# Altium integrated library WCAP-ATUL_rev15a.intlib: 117 symbols (part 1 of 2) (continued)
## WCAP-ATUL 5x11x2x0.5 860040572001
designator C?, comment 33 μF
WCAP-ATUL Aluminum Electrolytic Capacitors , 33 μF; + / - 20%; 35 V , 5 x 11; Manufacturer: Wurth Elektronik; partNo: 860040572001; E-mail: libraries@we-online.com; Characteristics: Aluminum Electrolytic Capacitor;Recommended soldering: Wave;Operating temperature: –40 °C to +105 °C;Minimized ESR and long life product series;Load life: 4000–10000 h @ +105 °C; ComponentLink1Description: Manufacturer; ComponentLink1URL: http://www.we-online.com; ComponentLink2Description: Datasheet; ComponentLink2URL: http://katalog.we-online.de/pbs/datasheet/860040572001.pdf; Created by: Karrer Zheng; Created Date: 5/13/2015; Capacitance: 33 μF; Application: Applied to high frequency secondary side output filter loop, general switching power supply, DC-DC converter, AC-DC converter, adapter, charger, TV, VCR, DC motor circuit filter, LCD TV digital audio, digital TV, digital camera, digital video camera, satellite receiver and etc.
footprint WCAP-ATUL 5x11x2x0.5
pins: 1, 2

## WCAP-ATUL 5x11x2x0.5 860040572002
designator C?, comment 47 μF
WCAP-ATUL Aluminum Electrolytic Capacitors , 47 μF; + / - 20%; 35 V , 5 x 11; Manufacturer: Wurth Elektronik; partNo: 860040572002; E-mail: libraries@we-online.com; Characteristics: Aluminum Electrolytic Capacitor;Recommended soldering: Wave;Operating temperature: –40 °C to +105 °C;Minimized ESR and long life product series;Load life: 4000–10000 h @ +105 °C; ComponentLink1Description: Manufacturer; ComponentLink1URL: http://www.we-online.com; ComponentLink2Description: Datasheet; ComponentLink2URL: http://katalog.we-online.de/pbs/datasheet/860040572002.pdf; Created by: Karrer Zheng; Created Date: 5/13/2015; Capacitance: 47 μF; Application: Applied to high frequency secondary side output filter loop, general switching power supply, DC-DC converter, AC-DC converter, adapter, charger, TV, VCR, DC motor circuit filter, LCD TV digital audio, digital TV, digital camera, digital video camera, satellite receiver and etc.
footprint WCAP-ATUL 5x11x2x0.5
pins: 1, 2

## WCAP-ATUL 6.3x11x2.5x0.5 860040573003
designator C?, comment 56 μF
WCAP-ATUL Aluminum Electrolytic Capacitors , 56 μF; + / - 20%; 35 V , 6,3 x 11; Manufacturer: Wurth Elektronik; partNo: 860040573003; E-mail: libraries@we-online.com; Characteristics: Aluminum Electrolytic Capacitor;Recommended soldering: Wave;Operating temperature: –40 °C to +105 °C;Minimized ESR and long life product series;Load life: 4000–10000 h @ +105 °C; ComponentLink1Description: Manufacturer; ComponentLink1URL: http://www.we-online.com; ComponentLink2Description: Datasheet; ComponentLink2URL: http://katalog.we-online.de/pbs/datasheet/860040573003.pdf; Created by: Karrer Zheng; Created Date: 5/13/2015; Capacitance: 56 μF; Application: Applied to high frequency secondary side output filter loop, general switching power supply, DC-DC converter, AC-DC converter, adapter, charger, TV, VCR, DC motor circuit filter, LCD TV digital audio, digital TV, digital camera, digital video camera, satellite receiver and etc.
footprint WCAP-ATUL 6.3x11x2.5x0.5
pins: 1, 2

## WCAP-ATUL 6.3x11x2.5x0.5 860040573004
designator C?, comment 100 μF
WCAP-ATUL Aluminum Electrolytic Capacitors , 100 μF; + / - 20%; 35 V , 6,3 x 11; Manufacturer: Wurth Elektronik; partNo: 860040573004; E-mail: libraries@we-online.com; Characteristics: Aluminum Electrolytic Capacitor;Recommended soldering: Wave;Operating temperature: –40 °C to +105 °C;Minimized ESR and long life product series;Load life: 4000–10000 h @ +105 °C; ComponentLink1Description: Manufacturer; ComponentLink1URL: http://www.we-online.com; ComponentLink2Description: Datasheet; ComponentLink2URL: http://katalog.we-online.de/pbs/datasheet/860040573004.pdf; Created by: Karrer Zheng; Created Date: 5/13/2015; Capacitance: 100 μF; Application: Applied to high frequency secondary side output filter loop, general switching power supply, DC-DC converter, AC-DC converter, adapter, charger, TV, VCR, DC motor circuit filter, LCD TV digital audio, digital TV, digital camera, digital video camera, satellite receiver and etc.
footprint WCAP-ATUL 6.3x11x2.5x0.5
pins: 1, 2

## WCAP-ATUL 8x11.5x3.5x0.5 860040574005
designator C?, comment 150 μF
WCAP-ATUL Aluminum Electrolytic Capacitors , 150 μF; + / - 20%; 35 V , 8 x 11,5; Manufacturer: Wurth Elektronik; partNo: 860040574005; E-mail: libraries@we-online.com; Characteristics: Aluminum Electrolytic Capacitor;Recommended soldering: Wave;Operating temperature: –40 °C to +105 °C;Minimized ESR and long life product series;Load life: 4000–10000 h @ +105 °C; ComponentLink1Description: Manufacturer; ComponentLink1URL: http://www.we-online.com; ComponentLink2Description: Datasheet; ComponentLink2URL: http://katalog.we-online.de/pbs/datasheet/860040574005.pdf; Created by: Karrer Zheng; Created Date: 5/13/2015; Capacitance: 150 μF; Application: Applied to high frequency secondary side output filter loop, general switching power supply, DC-DC converter, AC-DC converter, adapter, charger, TV, VCR, DC motor circuit filter, LCD TV digital audio, digital TV, digital camera, digital video camera, satellite receiver and etc.
footprint WCAP-ATUL 8x11.5x3.5x0.5
pins: 1, 2

## WCAP-ATUL 8x16x3.5x0.5 860040574006
designator C?, comment 220 μF
WCAP-ATUL Aluminum Electrolytic Capacitors , 220 μF; + / - 20%; 35 V , 8 x 16; Manufacturer: Wurth Elektronik; partNo: 860040574006; E-mail: libraries@we-online.com; Characteristics: Aluminum Electrolytic Capacitor;Recommended soldering: Wave;Operating temperature: –40 °C to +105 °C;Minimized ESR and long life product series;Load life: 4000–10000 h @ +105 °C; ComponentLink1Description: Manufacturer; ComponentLink1URL: http://www.we-online.com; ComponentLink2Description: Datasheet; ComponentLink2URL: http://katalog.we-online.de/pbs/datasheet/860040574006.pdf; Created by: Karrer Zheng; Created Date: 5/13/2015; Capacitance: 220 μF; Application: Applied to high frequency secondary side output filter loop, general switching power supply, DC-DC converter, AC-DC converter, adapter, charger, TV, VCR, DC motor circuit filter, LCD TV digital audio, digital TV, digital camera, digital video camera, satellite receiver and etc.
footprint WCAP-ATUL 8x16x3.5x0.5
pins: 1, 2

## WCAP-ATUL 8x20x3.5x0.6 860040574008
designator C?, comment 270 μF
WCAP-ATUL Aluminum Electrolytic Capacitors , 270 μF; + / - 20%; 35 V , 8 x 20; Manufacturer: Wurth Elektronik; partNo: 860040574008; E-mail: libraries@we-online.com; Characteristics: Aluminum Electrolytic Capacitor;Recommended soldering: Wave;Operating temperature: –40 °C to +105 °C;Minimized ESR and long life product series;Load life: 4000–10000 h @ +105 °C; ComponentLink1Description: Manufacturer; ComponentLink1URL: http://www.we-online.com; ComponentLink2Description: Datasheet; ComponentLink2URL: http://katalog.we-online.de/pbs/datasheet/860040574008.pdf; Created by: Karrer Zheng; Created Date: 5/13/2015; Capacitance: 270 μF; Application: Applied to high frequency secondary side output filter loop, general switching power supply, DC-DC converter, AC-DC converter, adapter, charger, TV, VCR, DC motor circuit filter, LCD TV digital audio, digital TV, digital camera, digital video camera, satellite receiver and etc.
footprint WCAP-ATUL 8x20x3.5x0.6
pins: 1, 2

## WCAP-ATUL 10x12.5x5x0.6 860040575007
designator C?, comment 220 μF
WCAP-ATUL Aluminum Electrolytic Capacitors , 220 μF; + / - 20%; 35 V , 10 x 12,5; Manufacturer: Wurth Elektronik; partNo: 860040575007; E-mail: libraries@we-online.com; Characteristics: Aluminum Electrolytic Capacitor;Recommended soldering: Wave;Operating temperature: –40 °C to +105 °C;Minimized ESR and long life product series;Load life: 4000–10000 h @ +105 °C; ComponentLink1Description: Manufacturer; ComponentLink1URL: http://www.we-online.com; ComponentLink2Description: Datasheet; ComponentLink2URL: http://katalog.we-online.de/pbs/datasheet/860040575007.pdf; Created by: Karrer Zheng; Created Date: 5/13/2015; Capacitance: 220 μF; Application: Applied to high frequency secondary side output filter loop, general switching power supply, DC-DC converter, AC-DC converter, adapter, charger, TV, VCR, DC motor circuit filter, LCD TV digital audio, digital TV, digital camera, digital video camera, satellite receiver and etc.
footprint WCAP-ATUL 10x12.5x5x0.6
pins: 1, 2

## WCAP-ATUL 10x16x5x0.6 860040575009
designator C?, comment 330 μF
WCAP-ATUL Aluminum Electrolytic Capacitors , 330 μF; + / - 20%; 35 V , 10 x 16; Manufacturer: Wurth Elektronik; partNo: 860040575009; E-mail: libraries@we-online.com; Characteristics: Aluminum Electrolytic Capacitor;Recommended soldering: Wave;Operating temperature: –40 °C to +105 °C;Minimized ESR and long life product series;Load life: 4000–10000 h @ +105 °C; ComponentLink1Description: Manufacturer; ComponentLink1URL: http://www.we-online.com; ComponentLink2Description: Datasheet; ComponentLink2URL: http://katalog.we-online.de/pbs/datasheet/860040575009.pdf; Created by: Karrer Zheng; Created Date: 5/13/2015; Capacitance: 330 μF; Application: Applied to high frequency secondary side output filter loop, general switching power supply, DC-DC converter, AC-DC converter, adapter, charger, TV, VCR, DC motor circuit filter, LCD TV digital audio, digital TV, digital camera, digital video camera, satellite receiver and etc.
footprint WCAP-ATUL 10x16x5x0.6
pins: 1, 2

## WCAP-ATUL 10x20x5x0.6 860040575010
designator C?, comment 470 μF
WCAP-ATUL Aluminum Electrolytic Capacitors , 470 μF; + / - 20%; 35 V , 10 x 20; Manufacturer: Wurth Elektronik; partNo: 860040575010; E-mail: libraries@we-online.com; Characteristics: Aluminum Electrolytic Capacitor;Recommended soldering: Wave;Operating temperature: –40 °C to +105 °C;Minimized ESR and long life product series;Load life: 4000–10000 h @ +105 °C; ComponentLink1Description: Manufacturer; ComponentLink1URL: http://www.we-online.com; ComponentLink2Description: Datasheet; ComponentLink2URL: http://katalog.we-online.de/pbs/datasheet/860040575010.pdf; Created by: Karrer Zheng; Created Date: 5/13/2015; Capacitance: 470 μF; Application: Applied to high frequency secondary side output filter loop, general switching power supply, DC-DC converter, AC-DC converter, adapter, charger, TV, VCR, DC motor circuit filter, LCD TV digital audio, digital TV, digital camera, digital video camera, satellite receiver and etc.
footprint WCAP-ATUL 10x20x5x0.6
pins: 1, 2

## WCAP-ATUL 10x25x5x0.6 860040575011
designator C?, comment 560 μF
WCAP-ATUL Aluminum Electrolytic Capacitors , 560 μF; + / - 20%; 35 V , 10 x 25; Manufacturer: Wurth Elektronik; partNo: 860040575011; E-mail: libraries@we-online.com; Characteristics: Aluminum Electrolytic Capacitor;Recommended soldering: Wave;Operating temperature: –40 °C to +105 °C;Minimized ESR and long life product series;Load life: 4000–10000 h @ +105 °C; ComponentLink1Description: Manufacturer; ComponentLink1URL: http://www.we-online.com; ComponentLink2Description: Datasheet; ComponentLink2URL: http://katalog.we-online.de/pbs/datasheet/860040575011.pdf; Created by: Karrer Zheng; Created Date: 5/13/2015; Capacitance: 560 μF; Application: Applied to high frequency secondary side output filter loop, general switching power supply, DC-DC converter, AC-DC converter, adapter, charger, TV, VCR, DC motor circuit filter, LCD TV digital audio, digital TV, digital camera, digital video camera, satellite receiver and etc.
footprint WCAP-ATUL 10x25x5x0.6
pins: 1, 2

## WCAP-ATUL 10x30x5x0.6 860040575012
designator C?, comment 680 μF
WCAP-ATUL Aluminum Electrolytic Capacitors , 680 μF; + / - 20%; 35 V , 10 x 30; Manufacturer: Wurth Elektronik; partNo: 860040575012; E-mail: libraries@we-online.com; Characteristics: Aluminum Electrolytic Capacitor;Recommended soldering: Wave;Operating temperature: –40 °C to +105 °C;Minimized ESR and long life product series;Load life: 4000–10000 h @ +105 °C; ComponentLink1Description: Manufacturer; ComponentLink1URL: http://www.we-online.com; ComponentLink2Description: Datasheet; ComponentLink2URL: http://katalog.we-online.de/pbs/datasheet/860040575012.pdf; Created by: Karrer Zheng; Created Date: 5/13/2015; Capacitance: 680 μF; Application: Applied to high frequency secondary side output filter loop, general switching power supply, DC-DC converter, AC-DC converter, adapter, charger, TV, VCR, DC motor circuit filter, LCD TV digital audio, digital TV, digital camera, digital video camera, satellite receiver and etc.
footprint WCAP-ATUL 10x30x5x0.6
pins: 1, 2

## WCAP-ATUL 13x20x5x0.6 860040578013
designator C?, comment 680 μF
WCAP-ATUL Aluminum Electrolytic Capacitors , 680 μF; + / - 20%; 35 V , 13 x 20; Manufacturer: Wurth Elektronik; partNo: 860040578013; E-mail: libraries@we-online.com; Characteristics: Aluminum Electrolytic Capacitor;Recommended soldering: Wave;Operating temperature: –40 °C to +105 °C;Minimized ESR and long life product series;Load life: 4000–10000 h @ +105 °C; ComponentLink1Description: Manufacturer; ComponentLink1URL: http://www.we-online.com; ComponentLink2Description: Datasheet; ComponentLink2URL: http://katalog.we-online.de/pbs/datasheet/860040578013.pdf; Created by: Karrer Zheng; Created Date: 5/13/2015; Capacitance: 680 μF; Application: Applied to high frequency secondary side output filter loop, general switching power supply, DC-DC converter, AC-DC converter, adapter, charger, TV, VCR, DC motor circuit filter, LCD TV digital audio, digital TV, digital camera, digital video camera, satellite receiver and etc.
footprint WCAP-ATUL 13x20x5x0.6
pins: 1, 2

## WCAP-ATUL 13x25x5x0.6 860040578014
designator C?, comment 1000 μF
WCAP-ATUL Aluminum Electrolytic Capacitors , 1000 μF; + / - 20%; 35 V , 13 x 25; Manufacturer: Wurth Elektronik; partNo: 860040578014; E-mail: libraries@we-online.com; Characteristics: Aluminum Electrolytic Capacitor;Recommended soldering: Wave;Operating temperature: –40 °C to +105 °C;Minimized ESR and long life product series;Load life: 4000–10000 h @ +105 °C; ComponentLink1Description: Manufacturer; ComponentLink1URL: http://www.we-online.com; ComponentLink2Description: Datasheet; ComponentLink2URL: http://katalog.we-online.de/pbs/datasheet/860040578014.pdf; Created by: Karrer Zheng; Created Date: 5/13/2015; Capacitance: 1000 μF; Application: Applied to high frequency secondary side output filter loop, general switching power supply, DC-DC converter, AC-DC converter, adapter, charger, TV, VCR, DC motor circuit filter, LCD TV digital audio, digital TV, digital camera, digital video camera, satellite receiver and etc.
footprint WCAP-ATUL 13x25x5x0.6
pins: 1, 2

## WCAP-ATUL 13x30x5x0.6 860040578015
designator C?, comment 1200 μF
WCAP-ATUL Aluminum Electrolytic Capacitors , 1200 μF; + / - 20%; 35 V , 13 x 30; Manufacturer: Wurth Elektronik; partNo: 860040578015; E-mail: libraries@we-online.com; Characteristics: Aluminum Electrolytic Capacitor;Recommended soldering: Wave;Operating temperature: –40 °C to +105 °C;Minimized ESR and long life product series;Load life: 4000–10000 h @ +105 °C; ComponentLink1Description: Manufacturer; ComponentLink1URL: http://www.we-online.com; ComponentLink2Description: Datasheet; ComponentLink2URL: http://katalog.we-online.de/pbs/datasheet/860040578015.pdf; Created by: Karrer Zheng; Created Date: 5/13/2015; Capacitance: 1200 μF; Application: Applied to high frequency secondary side output filter loop, general switching power supply, DC-DC converter, AC-DC converter, adapter, charger, TV, VCR, DC motor circuit filter, LCD TV digital audio, digital TV, digital camera, digital video camera, satellite receiver and etc.
footprint WCAP-ATUL 13x30x5x0.6
pins: 1, 2

## WCAP-ATUL 13x35x5x0.6 860040578017
designator C?, comment 1500 μF
WCAP-ATUL Aluminum Electrolytic Capacitors , 1500 μF; + / - 20%; 35 V , 13 x 35; Manufacturer: Wurth Elektronik; partNo: 860040578017; E-mail: libraries@we-online.com; Characteristics: Aluminum Electrolytic Capacitor;Recommended soldering: Wave;Operating temperature: –40 °C to +105 °C;Minimized ESR and long life product series;Load life: 4000–10000 h @ +105 °C; ComponentLink1Description: Manufacturer; ComponentLink1URL: http://www.we-online.com; ComponentLink2Description: Datasheet; ComponentLink2URL: http://katalog.we-online.de/pbs/datasheet/860040578017.pdf; Created by: Karrer Zheng; Created Date: 5/13/2015; Capacitance: 1500 μF; Application: Applied to high frequency secondary side output filter loop, general switching power supply, DC-DC converter, AC-DC converter, adapter, charger, TV, VCR, DC motor circuit filter, LCD TV digital audio, digital TV, digital camera, digital video camera, satellite receiver and etc.
footprint WCAP-ATUL 13x35x5x0.6
pins: 1, 2

## WCAP-ATUL 16x21x7.5x0.8 860040580016
designator C?, comment 1200 μF
WCAP-ATUL Aluminum Electrolytic Capacitors , 1200 μF; + / - 20%; 35 V , 16 x 21; Manufacturer: Wurth Elektronik; partNo: 860040580016; E-mail: libraries@we-online.com; Characteristics: Aluminum Electrolytic Capacitor;Recommended soldering: Wave;Operating temperature: –40 °C to +105 °C;Minimized ESR and long life product series;Load life: 4000–10000 h @ +105 °C; ComponentLink1Description: Manufacturer; ComponentLink1URL: http://www.we-online.com; ComponentLink2Description: Datasheet; ComponentLink2URL: http://katalog.we-online.de/pbs/datasheet/860040580016.pdf; Created by: Karrer Zheng; Created Date: 5/13/2015; Capacitance: 1200 μF; Application: Applied to high frequency secondary side output filter loop, general switching power supply, DC-DC converter, AC-DC converter, adapter, charger, TV, VCR, DC motor circuit filter, LCD TV digital audio, digital TV, digital camera, digital video camera, satellite receiver and etc.
footprint WCAP-ATUL 16x21x7.5x0.8
pins: 1, 2

## WCAP-ATUL 16x25x7.5x0.8 860040580018
designator C?, comment 1800 μF
WCAP-ATUL Aluminum Electrolytic Capacitors , 1800 μF; + / - 20%; 35 V , 16 x 25; Manufacturer: Wurth Elektronik; partNo: 860040580018; E-mail: libraries@we-online.com; Characteristics: Aluminum Electrolytic Capacitor;Recommended soldering: Wave;Operating temperature: –40 °C to +105 °C;Minimized ESR and long life product series;Load life: 4000–10000 h @ +105 °C; ComponentLink1Description: Manufacturer; ComponentLink1URL: http://www.we-online.com; ComponentLink2Description: Datasheet; ComponentLink2URL: http://katalog.we-online.de/pbs/datasheet/860040580018.pdf; Created by: Karrer Zheng; Created Date: 5/13/2015; Capacitance: 1800 μF; Application: Applied to high frequency secondary side output filter loop, general switching power supply, DC-DC converter, AC-DC converter, adapter, charger, TV, VCR, DC motor circuit filter, LCD TV digital audio, digital TV, digital camera, digital video camera, satellite receiver and etc.
footprint WCAP-ATUL 16x25x7.5x0.8
pins: 1, 2

## WCAP-ATUL 16x35.5x7.5x0.8 860040580019
designator C?, comment 2700 μF
WCAP-ATUL Aluminum Electrolytic Capacitors , 2700 μF; + / - 20%; 35 V , 16 x 35,5; Manufacturer: Wurth Elektronik; partNo: 860040580019; E-mail: libraries@we-online.com; Characteristics: Aluminum Electrolytic Capacitor;Recommended soldering: Wave;Operating temperature: –40 °C to +105 °C;Minimized ESR and long life product series;Load life: 4000–10000 h @ +105 °C; ComponentLink1Description: Manufacturer; ComponentLink1URL: http://www.we-online.com; ComponentLink2Description: Datasheet; ComponentLink2URL: http://katalog.we-online.de/pbs/datasheet/860040580019.pdf; Created by: Karrer Zheng; Created Date: 5/13/2015; Capacitance: 2700 μF; Application: Applied to high frequency secondary side output filter loop, general switching power supply, DC-DC converter, AC-DC converter, adapter, charger, TV, VCR, DC motor circuit filter, LCD TV digital audio, digital TV, digital camera, digital video camera, satellite receiver and etc.
footprint WCAP-ATUL 16x35.5x7.5x0.8
pins: 1, 2

## WCAP-ATUL 18x31.5x7.5x0.8 860040581020
designator C?, comment 2700 μF
WCAP-ATUL Aluminum Electrolytic Capacitors , 2700 μF; + / - 20%; 35 V , 18 x 31,5; Manufacturer: Wurth Elektronik; partNo: 860040581020; E-mail: libraries@we-online.com; Characteristics: Aluminum Electrolytic Capacitor;Recommended soldering: Wave;Operating temperature: –40 °C to +105 °C;Minimized ESR and long life product series;Load life: 4000–10000 h @ +105 °C; ComponentLink1Description: Manufacturer; ComponentLink1URL: http://www.we-online.com; ComponentLink2Description: Datasheet; ComponentLink2URL: http://katalog.we-online.de/pbs/datasheet/860040581020.pdf; Created by: Karrer Zheng; Created Date: 5/13/2015; Capacitance: 2700 μF; Application: Applied to high frequency secondary side output filter loop, general switching power supply, DC-DC converter, AC-DC converter, adapter, charger, TV, VCR, DC motor circuit filter, LCD TV digital audio, digital TV, digital camera, digital video camera, satellite receiver and etc.
footprint WCAP-ATUL 18x31.5x7.5x0.8
pins: 1, 2


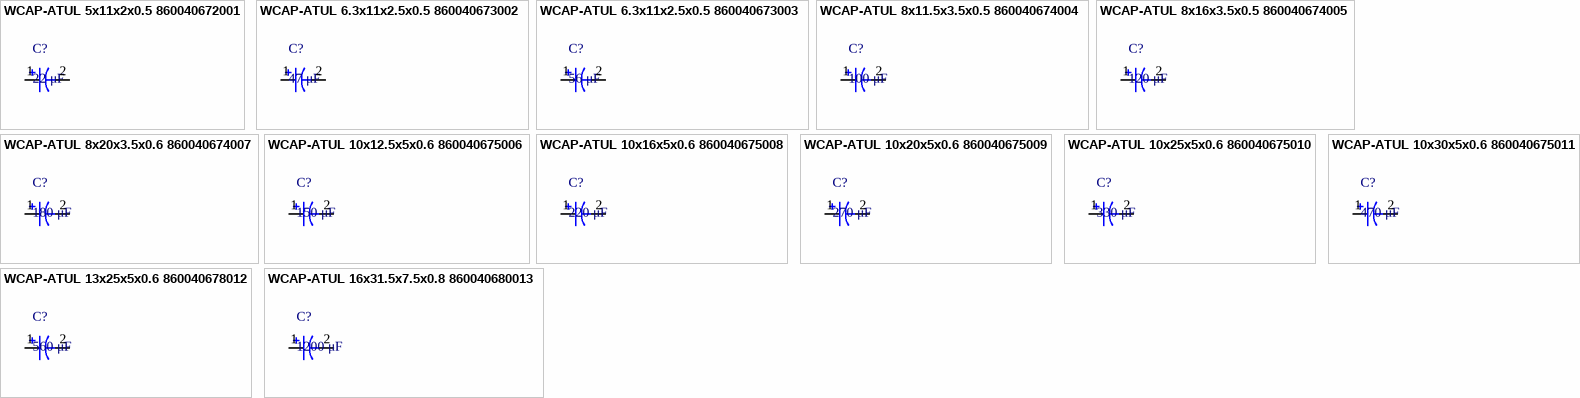
[diagram p4: symbols WCAP-ATUL 5x11x2x0.5 860040672001 to WCAP-ATUL 16x31.5x7.5x0.8 860040680013]

## WCAP-ATUL 5x11x2x0.5 860040672001
designator C?, comment 22 μF
WCAP-ATUL Aluminum Electrolytic Capacitors , 22 μF; + / - 20%; 50 V , 5 x 11; Manufacturer: Wurth Elektronik; partNo: 860040672001; E-mail: libraries@we-online.com; Characteristics: Aluminum Electrolytic Capacitor;Recommended soldering: Wave;Operating temperature: –40 °C to +105 °C;Minimized ESR and long life product series;Load life: 4000–10000 h @ +105 °C; ComponentLink1Description: Manufacturer; ComponentLink1URL: http://www.we-online.com; ComponentLink2Description: Datasheet; ComponentLink2URL: http://katalog.we-online.de/pbs/datasheet/860040672001.pdf; Created by: Karrer Zheng; Created Date: 5/13/2015; Capacitance: 22 μF; Application: Applied to high frequency secondary side output filter loop, general switching power supply, DC-DC converter, AC-DC converter, adapter, charger, TV, VCR, DC motor circuit filter, LCD TV digital audio, digital TV, digital camera, digital video camera, satellite receiver and etc.
footprint WCAP-ATUL 5x11x2x0.5
pins: 1, 2

## WCAP-ATUL 6.3x11x2.5x0.5 860040673002
designator C?, comment 47 μF
WCAP-ATUL Aluminum Electrolytic Capacitors , 47 μF; + / - 20%; 50 V , 6,3 x 11; Manufacturer: Wurth Elektronik; partNo: 860040673002; E-mail: libraries@we-online.com; Characteristics: Aluminum Electrolytic Capacitor;Recommended soldering: Wave;Operating temperature: –40 °C to +105 °C;Minimized ESR and long life product series;Load life: 4000–10000 h @ +105 °C; ComponentLink1Description: Manufacturer; ComponentLink1URL: http://www.we-online.com; ComponentLink2Description: Datasheet; ComponentLink2URL: http://katalog.we-online.de/pbs/datasheet/860040673002.pdf; Created by: Karrer Zheng; Created Date: 5/13/2015; Capacitance: 47 μF; Application: Applied to high frequency secondary side output filter loop, general switching power supply, DC-DC converter, AC-DC converter, adapter, charger, TV, VCR, DC motor circuit filter, LCD TV digital audio, digital TV, digital camera, digital video camera, satellite receiver and etc.
footprint WCAP-ATUL 6.3x11x2.5x0.5
pins: 1, 2

## WCAP-ATUL 6.3x11x2.5x0.5 860040673003
designator C?, comment 56 μF
WCAP-ATUL Aluminum Electrolytic Capacitors , 56 μF; + / - 20%; 50 V , 6,3 x 11; Manufacturer: Wurth Elektronik; partNo: 860040673003; E-mail: libraries@we-online.com; Characteristics: Aluminum Electrolytic Capacitor;Recommended soldering: Wave;Operating temperature: –40 °C to +105 °C;Minimized ESR and long life product series;Load life: 4000–10000 h @ +105 °C; ComponentLink1Description: Manufacturer; ComponentLink1URL: http://www.we-online.com; ComponentLink2Description: Datasheet; ComponentLink2URL: http://katalog.we-online.de/pbs/datasheet/860040673003.pdf; Created by: Karrer Zheng; Created Date: 5/13/2015; Capacitance: 56 μF; Application: Applied to high frequency secondary side output filter loop, general switching power supply, DC-DC converter, AC-DC converter, adapter, charger, TV, VCR, DC motor circuit filter, LCD TV digital audio, digital TV, digital camera, digital video camera, satellite receiver and etc.
footprint WCAP-ATUL 6.3x11x2.5x0.5
pins: 1, 2

## WCAP-ATUL 8x11.5x3.5x0.5 860040674004
designator C?, comment 100 μF
WCAP-ATUL Aluminum Electrolytic Capacitors , 100 μF; + / - 20%; 50 V , 8 x 11,5; Manufacturer: Wurth Elektronik; partNo: 860040674004; E-mail: libraries@we-online.com; Characteristics: Aluminum Electrolytic Capacitor;Recommended soldering: Wave;Operating temperature: –40 °C to +105 °C;Minimized ESR and long life product series;Load life: 4000–10000 h @ +105 °C; ComponentLink1Description: Manufacturer; ComponentLink1URL: http://www.we-online.com; ComponentLink2Description: Datasheet; ComponentLink2URL: http://katalog.we-online.de/pbs/datasheet/860040674004.pdf; Created by: Karrer Zheng; Created Date: 5/13/2015; Capacitance: 100 μF; Application: Applied to high frequency secondary side output filter loop, general switching power supply, DC-DC converter, AC-DC converter, adapter, charger, TV, VCR, DC motor circuit filter, LCD TV digital audio, digital TV, digital camera, digital video camera, satellite receiver and etc.
footprint WCAP-ATUL 8x11.5x3.5x0.5
pins: 1, 2

## WCAP-ATUL 8x16x3.5x0.5 860040674005
designator C?, comment 120 μF
WCAP-ATUL Aluminum Electrolytic Capacitors , 120 μF; + / - 20%; 50 V , 8 x 16; Manufacturer: Wurth Elektronik; partNo: 860040674005; E-mail: libraries@we-online.com; Characteristics: Aluminum Electrolytic Capacitor;Recommended soldering: Wave;Operating temperature: –40 °C to +105 °C;Minimized ESR and long life product series;Load life: 4000–10000 h @ +105 °C; ComponentLink1Description: Manufacturer; ComponentLink1URL: http://www.we-online.com; ComponentLink2Description: Datasheet; ComponentLink2URL: http://katalog.we-online.de/pbs/datasheet/860040674005.pdf; Created by: Karrer Zheng; Created Date: 5/13/2015; Capacitance: 120 μF; Application: Applied to high frequency secondary side output filter loop, general switching power supply, DC-DC converter, AC-DC converter, adapter, charger, TV, VCR, DC motor circuit filter, LCD TV digital audio, digital TV, digital camera, digital video camera, satellite receiver and etc.
footprint WCAP-ATUL 8x16x3.5x0.5
pins: 1, 2

## WCAP-ATUL 8x20x3.5x0.6 860040674007
designator C?, comment 180 μF
WCAP-ATUL Aluminum Electrolytic Capacitors , 180 μF; + / - 20%; 50 V , 8 x 20; Manufacturer: Wurth Elektronik; partNo: 860040674007; E-mail: libraries@we-online.com; Characteristics: Aluminum Electrolytic Capacitor;Recommended soldering: Wave;Operating temperature: –40 °C to +105 °C;Minimized ESR and long life product series;Load life: 4000–10000 h @ +105 °C; ComponentLink1Description: Manufacturer; ComponentLink1URL: http://www.we-online.com; ComponentLink2Description: Datasheet; ComponentLink2URL: http://katalog.we-online.de/pbs/datasheet/860040674007.pdf; Created by: Karrer Zheng; Created Date: 5/13/2015; Capacitance: 180 μF; Application: Applied to high frequency secondary side output filter loop, general switching power supply, DC-DC converter, AC-DC converter, adapter, charger, TV, VCR, DC motor circuit filter, LCD TV digital audio, digital TV, digital camera, digital video camera, satellite receiver and etc.
footprint WCAP-ATUL 8x20x3.5x0.6
pins: 1, 2

## WCAP-ATUL 10x12.5x5x0.6 860040675006
designator C?, comment 150 μF
WCAP-ATUL Aluminum Electrolytic Capacitors , 150 μF; + / - 20%; 50 V , 10 x 12,5; Manufacturer: Wurth Elektronik; partNo: 860040675006; E-mail: libraries@we-online.com; Characteristics: Aluminum Electrolytic Capacitor;Recommended soldering: Wave;Operating temperature: –40 °C to +105 °C;Minimized ESR and long life product series;Load life: 4000–10000 h @ +105 °C; ComponentLink1Description: Manufacturer; ComponentLink1URL: http://www.we-online.com; ComponentLink2Description: Datasheet; ComponentLink2URL: http://katalog.we-online.de/pbs/datasheet/860040675006.pdf; Created by: Karrer Zheng; Created Date: 5/13/2015; Capacitance: 150 μF; Application: Applied to high frequency secondary side output filter loop, general switching power supply, DC-DC converter, AC-DC converter, adapter, charger, TV, VCR, DC motor circuit filter, LCD TV digital audio, digital TV, digital camera, digital video camera, satellite receiver and etc.
footprint WCAP-ATUL 10x12.5x5x0.6
pins: 1, 2

## WCAP-ATUL 10x16x5x0.6 860040675008
designator C?, comment 220 μF
WCAP-ATUL Aluminum Electrolytic Capacitors , 220 μF; + / - 20%; 50 V , 10 x 16; Manufacturer: Wurth Elektronik; partNo: 860040675008; E-mail: libraries@we-online.com; Characteristics: Aluminum Electrolytic Capacitor;Recommended soldering: Wave;Operating temperature: –40 °C to +105 °C;Minimized ESR and long life product series;Load life: 4000–10000 h @ +105 °C; ComponentLink1Description: Manufacturer; ComponentLink1URL: http://www.we-online.com; ComponentLink2Description: Datasheet; ComponentLink2URL: http://katalog.we-online.de/pbs/datasheet/860040675008.pdf; Created by: Karrer Zheng; Created Date: 5/13/2015; Capacitance: 220 μF; Application: Applied to high frequency secondary side output filter loop, general switching power supply, DC-DC converter, AC-DC converter, adapter, charger, TV, VCR, DC motor circuit filter, LCD TV digital audio, digital TV, digital camera, digital video camera, satellite receiver and etc.
footprint WCAP-ATUL 10x16x5x0.6
pins: 1, 2

## WCAP-ATUL 10x20x5x0.6 860040675009
designator C?, comment 270 μF
WCAP-ATUL Aluminum Electrolytic Capacitors , 270 μF; + / - 20%; 50 V , 10 x 20; Manufacturer: Wurth Elektronik; partNo: 860040675009; E-mail: libraries@we-online.com; Characteristics: Aluminum Electrolytic Capacitor;Recommended soldering: Wave;Operating temperature: –40 °C to +105 °C;Minimized ESR and long life product series;Load life: 4000–10000 h @ +105 °C; ComponentLink1Description: Manufacturer; ComponentLink1URL: http://www.we-online.com; ComponentLink2Description: Datasheet; ComponentLink2URL: http://katalog.we-online.de/pbs/datasheet/860040675009.pdf; Created by: Karrer Zheng; Created Date: 5/13/2015; Capacitance: 270 μF; Application: Applied to high frequency secondary side output filter loop, general switching power supply, DC-DC converter, AC-DC converter, adapter, charger, TV, VCR, DC motor circuit filter, LCD TV digital audio, digital TV, digital camera, digital video camera, satellite receiver and etc.
footprint WCAP-ATUL 10x20x5x0.6
pins: 1, 2

## WCAP-ATUL 10x25x5x0.6 860040675010
designator C?, comment 330 μF
WCAP-ATUL Aluminum Electrolytic Capacitors , 330 μF; + / - 20%; 50 V , 10 x 25; Manufacturer: Wurth Elektronik; partNo: 860040675010; E-mail: libraries@we-online.com; Characteristics: Aluminum Electrolytic Capacitor;Recommended soldering: Wave;Operating temperature: –40 °C to +105 °C;Minimized ESR and long life product series;Load life: 4000–10000 h @ +105 °C; ComponentLink1Description: Manufacturer; ComponentLink1URL: http://www.we-online.com; ComponentLink2Description: Datasheet; ComponentLink2URL: http://katalog.we-online.de/pbs/datasheet/860040675010.pdf; Created by: Karrer Zheng; Created Date: 5/13/2015; Capacitance: 330 μF; Application: Applied to high frequency secondary side output filter loop, general switching power supply, DC-DC converter, AC-DC converter, adapter, charger, TV, VCR, DC motor circuit filter, LCD TV digital audio, digital TV, digital camera, digital video camera, satellite receiver and etc.
footprint WCAP-ATUL 10x25x5x0.6
pins: 1, 2

## WCAP-ATUL 10x30x5x0.6 860040675011
designator C?, comment 470 μF
WCAP-ATUL Aluminum Electrolytic Capacitors , 470 μF; + / - 20%; 50 V , 10 x 30; Manufacturer: Wurth Elektronik; partNo: 860040675011; E-mail: libraries@we-online.com; Characteristics: Aluminum Electrolytic Capacitor;Recommended soldering: Wave;Operating temperature: –40 °C to +105 °C;Minimized ESR and long life product series;Load life: 4000–10000 h @ +105 °C; ComponentLink1Description: Manufacturer; ComponentLink1URL: http://www.we-online.com; ComponentLink2Description: Datasheet; ComponentLink2URL: http://katalog.we-online.de/pbs/datasheet/860040675011.pdf; Created by: Karrer Zheng; Created Date: 5/13/2015; Capacitance: 470 μF; Application: Applied to high frequency secondary side output filter loop, general switching power supply, DC-DC converter, AC-DC converter, adapter, charger, TV, VCR, DC motor circuit filter, LCD TV digital audio, digital TV, digital camera, digital video camera, satellite receiver and etc.
footprint WCAP-ATUL 10x30x5x0.6
pins: 1, 2

## WCAP-ATUL 13x25x5x0.6 860040678012
designator C?, comment 560 μF
WCAP-ATUL Aluminum Electrolytic Capacitors , 560 μF; + / - 20%; 50 V , 13 x 25; Manufacturer: Wurth Elektronik; partNo: 860040678012; E-mail: libraries@we-online.com; Characteristics: Aluminum Electrolytic Capacitor;Recommended soldering: Wave;Operating temperature: –40 °C to +105 °C;Minimized ESR and long life product series;Load life: 4000–10000 h @ +105 °C; ComponentLink1Description: Manufacturer; ComponentLink1URL: http://www.we-online.com; ComponentLink2Description: Datasheet; ComponentLink2URL: http://katalog.we-online.de/pbs/datasheet/860040678012.pdf; Created by: Karrer Zheng; Created Date: 5/13/2015; Capacitance: 560 μF; Application: Applied to high frequency secondary side output filter loop, general switching power supply, DC-DC converter, AC-DC converter, adapter, charger, TV, VCR, DC motor circuit filter, LCD TV digital audio, digital TV, digital camera, digital video camera, satellite receiver and etc.
footprint WCAP-ATUL 13x25x5x0.6
pins: 1, 2

## WCAP-ATUL 16x31.5x7.5x0.8 860040680013
designator C?, comment 1200 μF
WCAP-ATUL Aluminum Electrolytic Capacitors , 1200 μF; + / - 20%; 50 V , 16 x 31,5; Manufacturer: Wurth Elektronik; partNo: 860040680013; E-mail: libraries@we-online.com; Characteristics: Aluminum Electrolytic Capacitor;Recommended soldering: Wave;Operating temperature: –40 °C to +105 °C;Minimized ESR and long life product series;Load life: 4000–10000 h @ +105 °C; ComponentLink1Description: Manufacturer; ComponentLink1URL: http://www.we-online.com; ComponentLink2Description: Datasheet; ComponentLink2URL: http://katalog.we-online.de/pbs/datasheet/860040680013.pdf; Created by: Karrer Zheng; Created Date: 5/13/2015; Capacitance: 1200 μF; Application: Applied to high frequency secondary side output filter loop, general switching power supply, DC-DC converter, AC-DC converter, adapter, charger, TV, VCR, DC motor circuit filter, LCD TV digital audio, digital TV, digital camera, digital video camera, satellite receiver and etc.
footprint WCAP-ATUL 16x31.5x7.5x0.8
pins: 1, 2


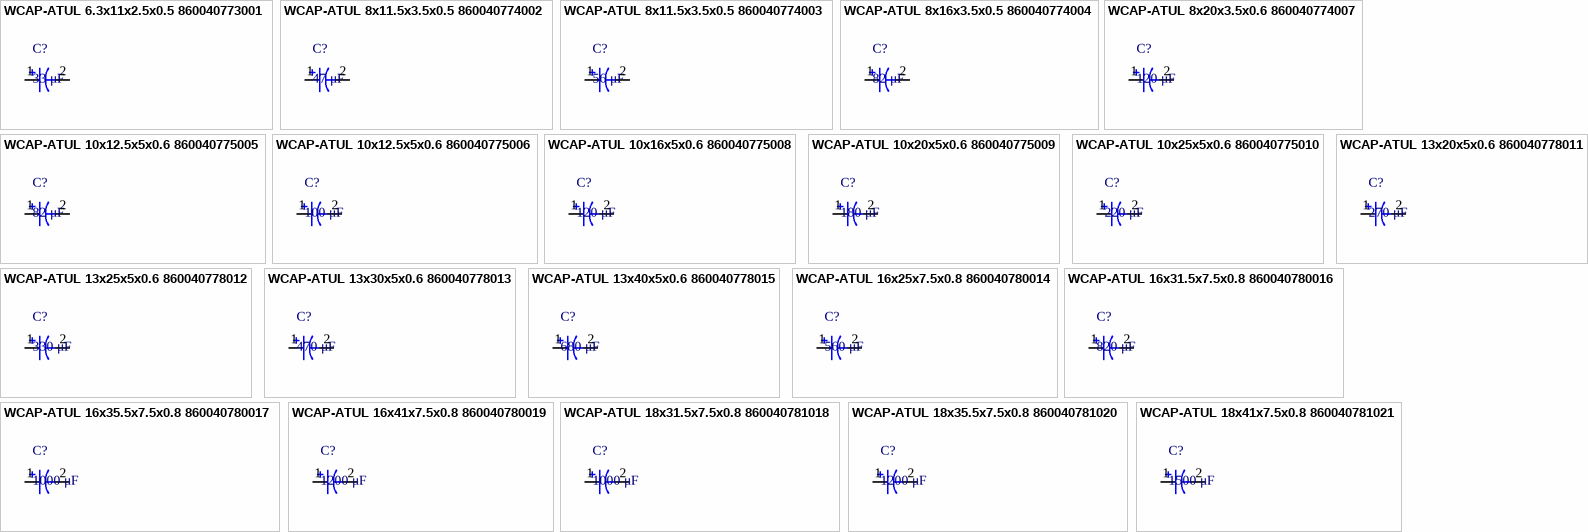
[diagram p5: symbols WCAP-ATUL 6.3x11x2.5x0.5 860040773001 to WCAP-ATUL 18x41x7.5x0.8 860040781021]

## WCAP-ATUL 6.3x11x2.5x0.5 860040773001
designator C?, comment 33 μF
WCAP-ATUL Aluminum Electrolytic Capacitors , 33 μF; + / - 20%; 63 V , 6,3 x 11; Manufacturer: Wurth Elektronik; partNo: 860040773001; E-mail: libraries@we-online.com; Characteristics: Aluminum Electrolytic Capacitor;Recommended soldering: Wave;Operating temperature: –40 °C to +105 °C;Minimized ESR and long life product series;Load life: 4000–10000 h @ +105 °C; ComponentLink1Description: Manufacturer; ComponentLink1URL: http://www.we-online.com; ComponentLink2Description: Datasheet; ComponentLink2URL: http://katalog.we-online.de/pbs/datasheet/860040773001.pdf; Created by: Karrer Zheng; Created Date: 5/13/2015; Capacitance: 33 μF; Application: Applied to high frequency secondary side output filter loop, general switching power supply, DC-DC converter, AC-DC converter, adapter, charger, TV, VCR, DC motor circuit filter, LCD TV digital audio, digital TV, digital camera, digital video camera, satellite receiver and etc.
footprint WCAP-ATUL 6.3x11x2.5x0.5
pins: 1, 2

## WCAP-ATUL 8x11.5x3.5x0.5 860040774002
designator C?, comment 47 μF
WCAP-ATUL Aluminum Electrolytic Capacitors , 47 μF; + / - 20%; 63 V , 8 x 11,5; Manufacturer: Wurth Elektronik; partNo: 860040774002; E-mail: libraries@we-online.com; Characteristics: Aluminum Electrolytic Capacitor;Recommended soldering: Wave;Operating temperature: –40 °C to +105 °C;Minimized ESR and long life product series;Load life: 4000–10000 h @ +105 °C; ComponentLink1Description: Manufacturer; ComponentLink1URL: http://www.we-online.com; ComponentLink2Description: Datasheet; ComponentLink2URL: http://katalog.we-online.de/pbs/datasheet/860040774002.pdf; Created by: Karrer Zheng; Created Date: 5/13/2015; Capacitance: 47 μF; Application: Applied to high frequency secondary side output filter loop, general switching power supply, DC-DC converter, AC-DC converter, adapter, charger, TV, VCR, DC motor circuit filter, LCD TV digital audio, digital TV, digital camera, digital video camera, satellite receiver and etc.
footprint WCAP-ATUL 8x11.5x3.5x0.5
pins: 1, 2

## WCAP-ATUL 8x11.5x3.5x0.5 860040774003
designator C?, comment 56 μF
WCAP-ATUL Aluminum Electrolytic Capacitors , 56 μF; + / - 20%; 63 V , 8 x 11,5; Manufacturer: Wurth Elektronik; partNo: 860040774003; E-mail: libraries@we-online.com; Characteristics: Aluminum Electrolytic Capacitor;Recommended soldering: Wave;Operating temperature: –40 °C to +105 °C;Minimized ESR and long life product series;Load life: 4000–10000 h @ +105 °C; ComponentLink1Description: Manufacturer; ComponentLink1URL: http://www.we-online.com; ComponentLink2Description: Datasheet; ComponentLink2URL: http://katalog.we-online.de/pbs/datasheet/860040774003.pdf; Created by: Karrer Zheng; Created Date: 5/13/2015; Capacitance: 56 μF; Application: Applied to high frequency secondary side output filter loop, general switching power supply, DC-DC converter, AC-DC converter, adapter, charger, TV, VCR, DC motor circuit filter, LCD TV digital audio, digital TV, digital camera, digital video camera, satellite receiver and etc.
footprint WCAP-ATUL 8x11.5x3.5x0.5
pins: 1, 2

## WCAP-ATUL 8x16x3.5x0.5 860040774004
designator C?, comment 82 μF
WCAP-ATUL Aluminum Electrolytic Capacitors , 82 μF; + / - 20%; 63 V , 8 x 16; Manufacturer: Wurth Elektronik; partNo: 860040774004; E-mail: libraries@we-online.com; Characteristics: Aluminum Electrolytic Capacitor;Recommended soldering: Wave;Operating temperature: –40 °C to +105 °C;Minimized ESR and long life product series;Load life: 4000–10000 h @ +105 °C; ComponentLink1Description: Manufacturer; ComponentLink1URL: http://www.we-online.com; ComponentLink2Description: Datasheet; ComponentLink2URL: http://katalog.we-online.de/pbs/datasheet/860040774004.pdf; Created by: Karrer Zheng; Created Date: 5/13/2015; Capacitance: 82 μF; Application: Applied to high frequency secondary side output filter loop, general switching power supply, DC-DC converter, AC-DC converter, adapter, charger, TV, VCR, DC motor circuit filter, LCD TV digital audio, digital TV, digital camera, digital video camera, satellite receiver and etc.
footprint WCAP-ATUL 8x16x3.5x0.5
pins: 1, 2

## WCAP-ATUL 8x20x3.5x0.6 860040774007
designator C?, comment 120 μF
WCAP-ATUL Aluminum Electrolytic Capacitors , 120 μF; + / - 20%; 63 V , 8 x 20; Manufacturer: Wurth Elektronik; partNo: 860040774007; E-mail: libraries@we-online.com; Characteristics: Aluminum Electrolytic Capacitor;Recommended soldering: Wave;Operating temperature: –40 °C to +105 °C;Minimized ESR and long life product series;Load life: 4000–10000 h @ +105 °C; ComponentLink1Description: Manufacturer; ComponentLink1URL: http://www.we-online.com; ComponentLink2Description: Datasheet; ComponentLink2URL: http://katalog.we-online.de/pbs/datasheet/860040774007.pdf; Created by: Karrer Zheng; Created Date: 5/13/2015; Capacitance: 120 μF; Application: Applied to high frequency secondary side output filter loop, general switching power supply, DC-DC converter, AC-DC converter, adapter, charger, TV, VCR, DC motor circuit filter, LCD TV digital audio, digital TV, digital camera, digital video camera, satellite receiver and etc.
footprint WCAP-ATUL 8x20x3.5x0.6
pins: 1, 2

## WCAP-ATUL 10x12.5x5x0.6 860040775005
designator C?, comment 82 μF
WCAP-ATUL Aluminum Electrolytic Capacitors , 82 μF; + / - 20%; 63 V , 10 x 12,5; Manufacturer: Wurth Elektronik; partNo: 860040775005; E-mail: libraries@we-online.com; Characteristics: Aluminum Electrolytic Capacitor;Recommended soldering: Wave;Operating temperature: –40 °C to +105 °C;Minimized ESR and long life product series;Load life: 4000–10000 h @ +105 °C; ComponentLink1Description: Manufacturer; ComponentLink1URL: http://www.we-online.com; ComponentLink2Description: Datasheet; ComponentLink2URL: http://katalog.we-online.de/pbs/datasheet/860040775005.pdf; Created by: Karrer Zheng; Created Date: 5/13/2015; Capacitance: 82 μF; Application: Applied to high frequency secondary side output filter loop, general switching power supply, DC-DC converter, AC-DC converter, adapter, charger, TV, VCR, DC motor circuit filter, LCD TV digital audio, digital TV, digital camera, digital video camera, satellite receiver and etc.
footprint WCAP-ATUL 10x12.5x5x0.6
pins: 1, 2

## WCAP-ATUL 10x12.5x5x0.6 860040775006
designator C?, comment 100 μF
WCAP-ATUL Aluminum Electrolytic Capacitors , 100 μF; + / - 20%; 63 V , 10 x 12,5; Manufacturer: Wurth Elektronik; partNo: 860040775006; E-mail: libraries@we-online.com; Characteristics: Aluminum Electrolytic Capacitor;Recommended soldering: Wave;Operating temperature: –40 °C to +105 °C;Minimized ESR and long life product series;Load life: 4000–10000 h @ +105 °C; ComponentLink1Description: Manufacturer; ComponentLink1URL: http://www.we-online.com; ComponentLink2Description: Datasheet; ComponentLink2URL: http://katalog.we-online.de/pbs/datasheet/860040775006.pdf; Created by: Karrer Zheng; Created Date: 5/13/2015; Capacitance: 100 μF; Application: Applied to high frequency secondary side output filter loop, general switching power supply, DC-DC converter, AC-DC converter, adapter, charger, TV, VCR, DC motor circuit filter, LCD TV digital audio, digital TV, digital camera, digital video camera, satellite receiver and etc.
footprint WCAP-ATUL 10x12.5x5x0.6
pins: 1, 2

## WCAP-ATUL 10x16x5x0.6 860040775008
designator C?, comment 120 μF
WCAP-ATUL Aluminum Electrolytic Capacitors , 120 μF; + / - 20%; 63 V , 10 x 16; Manufacturer: Wurth Elektronik; partNo: 860040775008; E-mail: libraries@we-online.com; Characteristics: Aluminum Electrolytic Capacitor;Recommended soldering: Wave;Operating temperature: –40 °C to +105 °C;Minimized ESR and long life product series;Load life: 4000–10000 h @ +105 °C; ComponentLink1Description: Manufacturer; ComponentLink1URL: http://www.we-online.com; ComponentLink2Description: Datasheet; ComponentLink2URL: http://katalog.we-online.de/pbs/datasheet/860040775008.pdf; Created by: Karrer Zheng; Created Date: 5/13/2015; Capacitance: 120 μF; Application: Applied to high frequency secondary side output filter loop, general switching power supply, DC-DC converter, AC-DC converter, adapter, charger, TV, VCR, DC motor circuit filter, LCD TV digital audio, digital TV, digital camera, digital video camera, satellite receiver and etc.
footprint WCAP-ATUL 10x16x5x0.6
pins: 1, 2

## WCAP-ATUL 10x20x5x0.6 860040775009
designator C?, comment 180 μF
WCAP-ATUL Aluminum Electrolytic Capacitors , 180 μF; + / - 20%; 63 V , 10 x 20; Manufacturer: Wurth Elektronik; partNo: 860040775009; E-mail: libraries@we-online.com; Characteristics: Aluminum Electrolytic Capacitor;Recommended soldering: Wave;Operating temperature: –40 °C to +105 °C;Minimized ESR and long life product series;Load life: 4000–10000 h @ +105 °C; ComponentLink1Description: Manufacturer; ComponentLink1URL: http://www.we-online.com; ComponentLink2Description: Datasheet; ComponentLink2URL: http://katalog.we-online.de/pbs/datasheet/860040775009.pdf; Created by: Karrer Zheng; Created Date: 5/13/2015; Capacitance: 180 μF; Application: Applied to high frequency secondary side output filter loop, general switching power supply, DC-DC converter, AC-DC converter, adapter, charger, TV, VCR, DC motor circuit filter, LCD TV digital audio, digital TV, digital camera, digital video camera, satellite receiver and etc.
footprint WCAP-ATUL 10x20x5x0.6
pins: 1, 2

## WCAP-ATUL 10x25x5x0.6 860040775010
designator C?, comment 220 μF
WCAP-ATUL Aluminum Electrolytic Capacitors , 220 μF; + / - 20%; 63 V , 10 x 25; Manufacturer: Wurth Elektronik; partNo: 860040775010; E-mail: libraries@we-online.com; Characteristics: Aluminum Electrolytic Capacitor;Recommended soldering: Wave;Operating temperature: –40 °C to +105 °C;Minimized ESR and long life product series;Load life: 4000–10000 h @ +105 °C; ComponentLink1Description: Manufacturer; ComponentLink1URL: http://www.we-online.com; ComponentLink2Description: Datasheet; ComponentLink2URL: http://katalog.we-online.de/pbs/datasheet/860040775010.pdf; Created by: Karrer Zheng; Created Date: 5/13/2015; Capacitance: 220 μF; Application: Applied to high frequency secondary side output filter loop, general switching power supply, DC-DC converter, AC-DC converter, adapter, charger, TV, VCR, DC motor circuit filter, LCD TV digital audio, digital TV, digital camera, digital video camera, satellite receiver and etc.
footprint WCAP-ATUL 10x25x5x0.6
pins: 1, 2

## WCAP-ATUL 13x20x5x0.6 860040778011
designator C?, comment 270 μF
WCAP-ATUL Aluminum Electrolytic Capacitors , 270 μF; + / - 20%; 63 V , 13 x 20; Manufacturer: Wurth Elektronik; partNo: 860040778011; E-mail: libraries@we-online.com; Characteristics: Aluminum Electrolytic Capacitor;Recommended soldering: Wave;Operating temperature: –40 °C to +105 °C;Minimized ESR and long life product series;Load life: 4000–10000 h @ +105 °C; ComponentLink1Description: Manufacturer; ComponentLink1URL: http://www.we-online.com; ComponentLink2Description: Datasheet; ComponentLink2URL: http://katalog.we-online.de/pbs/datasheet/860040778011.pdf; Created by: Karrer Zheng; Created Date: 5/13/2015; Capacitance: 270 μF; Application: Applied to high frequency secondary side output filter loop, general switching power supply, DC-DC converter, AC-DC converter, adapter, charger, TV, VCR, DC motor circuit filter, LCD TV digital audio, digital TV, digital camera, digital video camera, satellite receiver and etc.
footprint WCAP-ATUL 13x20x5x0.6
pins: 1, 2

## WCAP-ATUL 13x25x5x0.6 860040778012
designator C?, comment 330 μF
WCAP-ATUL Aluminum Electrolytic Capacitors , 330 μF; + / - 20%; 63 V , 13 x 25; Manufacturer: Wurth Elektronik; partNo: 860040778012; E-mail: libraries@we-online.com; Characteristics: Aluminum Electrolytic Capacitor;Recommended soldering: Wave;Operating temperature: –40 °C to +105 °C;Minimized ESR and long life product series;Load life: 4000–10000 h @ +105 °C; ComponentLink1Description: Manufacturer; ComponentLink1URL: http://www.we-online.com; ComponentLink2Description: Datasheet; ComponentLink2URL: http://katalog.we-online.de/pbs/datasheet/860040778012.pdf; Created by: Karrer Zheng; Created Date: 5/13/2015; Capacitance: 330 μF; Application: Applied to high frequency secondary side output filter loop, general switching power supply, DC-DC converter, AC-DC converter, adapter, charger, TV, VCR, DC motor circuit filter, LCD TV digital audio, digital TV, digital camera, digital video camera, satellite receiver and etc.
footprint WCAP-ATUL 13x25x5x0.6
pins: 1, 2

## WCAP-ATUL 13x30x5x0.6 860040778013
designator C?, comment 470 μF
WCAP-ATUL Aluminum Electrolytic Capacitors , 470 μF; + / - 20%; 63 V , 13 x 30; Manufacturer: Wurth Elektronik; partNo: 860040778013; E-mail: libraries@we-online.com; Characteristics: Aluminum Electrolytic Capacitor;Recommended soldering: Wave;Operating temperature: –40 °C to +105 °C;Minimized ESR and long life product series;Load life: 4000–10000 h @ +105 °C; ComponentLink1Description: Manufacturer; ComponentLink1URL: http://www.we-online.com; ComponentLink2Description: Datasheet; ComponentLink2URL: http://katalog.we-online.de/pbs/datasheet/860040778013.pdf; Created by: Karrer Zheng; Created Date: 5/13/2015; Capacitance: 470 μF; Application: Applied to high frequency secondary side output filter loop, general switching power supply, DC-DC converter, AC-DC converter, adapter, charger, TV, VCR, DC motor circuit filter, LCD TV digital audio, digital TV, digital camera, digital video camera, satellite receiver and etc.
footprint WCAP-ATUL 13x30x5x0.6
pins: 1, 2

## WCAP-ATUL 13x40x5x0.6 860040778015
designator C?, comment 680 μF
WCAP-ATUL Aluminum Electrolytic Capacitors , 680 μF; + / - 20%; 63 V , 13 x 40; Manufacturer: Wurth Elektronik; partNo: 860040778015; E-mail: libraries@we-online.com; Characteristics: Aluminum Electrolytic Capacitor;Recommended soldering: Wave;Operating temperature: –40 °C to +105 °C;Minimized ESR and long life product series;Load life: 4000–10000 h @ +105 °C; ComponentLink1Description: Manufacturer; ComponentLink1URL: http://www.we-online.com; ComponentLink2Description: Datasheet; ComponentLink2URL: http://katalog.we-online.de/pbs/datasheet/860040778015.pdf; Created by: Karrer Zheng; Created Date: 5/13/2015; Capacitance: 680 μF; Application: Applied to high frequency secondary side output filter loop, general switching power supply, DC-DC converter, AC-DC converter, adapter, charger, TV, VCR, DC motor circuit filter, LCD TV digital audio, digital TV, digital camera, digital video camera, satellite receiver and etc.
footprint WCAP-ATUL 13x40x5x0.6
pins: 1, 2

## WCAP-ATUL 16x25x7.5x0.8 860040780014
designator C?, comment 560 μF
WCAP-ATUL Aluminum Electrolytic Capacitors , 560 μF; + / - 20%; 63 V , 16 x 25; Manufacturer: Wurth Elektronik; partNo: 860040780014; E-mail: libraries@we-online.com; Characteristics: Aluminum Electrolytic Capacitor;Recommended soldering: Wave;Operating temperature: –40 °C to +105 °C;Minimized ESR and long life product series;Load life: 4000–10000 h @ +105 °C; ComponentLink1Description: Manufacturer; ComponentLink1URL: http://www.we-online.com; ComponentLink2Description: Datasheet; ComponentLink2URL: http://katalog.we-online.de/pbs/datasheet/860040780014.pdf; Created by: Karrer Zheng; Created Date: 5/13/2015; Capacitance: 560 μF; Application: Applied to high frequency secondary side output filter loop, general switching power supply, DC-DC converter, AC-DC converter, adapter, charger, TV, VCR, DC motor circuit filter, LCD TV digital audio, digital TV, digital camera, digital video camera, satellite receiver and etc.
footprint WCAP-ATUL 16x25x7.5x0.8
pins: 1, 2

## WCAP-ATUL 16x31.5x7.5x0.8 860040780016
designator C?, comment 820 μF
WCAP-ATUL Aluminum Electrolytic Capacitors , 820 μF; + / - 20%; 63 V , 16 x 31,5; Manufacturer: Wurth Elektronik; partNo: 860040780016; E-mail: libraries@we-online.com; Characteristics: Aluminum Electrolytic Capacitor;Recommended soldering: Wave;Operating temperature: –40 °C to +105 °C;Minimized ESR and long life product series;Load life: 4000–10000 h @ +105 °C; ComponentLink1Description: Manufacturer; ComponentLink1URL: http://www.we-online.com; ComponentLink2Description: Datasheet; ComponentLink2URL: http://katalog.we-online.de/pbs/datasheet/860040780016.pdf; Created by: Karrer Zheng; Created Date: 5/13/2015; Capacitance: 820 μF; Application: Applied to high frequency secondary side output filter loop, general switching power supply, DC-DC converter, AC-DC converter, adapter, charger, TV, VCR, DC motor circuit filter, LCD TV digital audio, digital TV, digital camera, digital video camera, satellite receiver and etc.
footprint WCAP-ATUL 16x31.5x7.5x0.8
pins: 1, 2

## WCAP-ATUL 16x35.5x7.5x0.8 860040780017
designator C?, comment 1000 μF
WCAP-ATUL Aluminum Electrolytic Capacitors , 1000 μF; + / - 20%; 63 V , 16 x 35,5; Manufacturer: Wurth Elektronik; partNo: 860040780017; E-mail: libraries@we-online.com; Characteristics: Aluminum Electrolytic Capacitor;Recommended soldering: Wave;Operating temperature: –40 °C to +105 °C;Minimized ESR and long life product series;Load life: 4000–10000 h @ +105 °C; ComponentLink1Description: Manufacturer; ComponentLink1URL: http://www.we-online.com; ComponentLink2Description: Datasheet; ComponentLink2URL: http://katalog.we-online.de/pbs/datasheet/860040780017.pdf; Created by: Karrer Zheng; Created Date: 5/13/2015; Capacitance: 1000 μF; Application: Applied to high frequency secondary side output filter loop, general switching power supply, DC-DC converter, AC-DC converter, adapter, charger, TV, VCR, DC motor circuit filter, LCD TV digital audio, digital TV, digital camera, digital video camera, satellite receiver and etc.
footprint WCAP-ATUL 16x35.5x7.5x0.8
pins: 1, 2

## WCAP-ATUL 16x41x7.5x0.8 860040780019
designator C?, comment 1200 μF
WCAP-ATUL Aluminum Electrolytic Capacitors , 1200 μF; + / - 20%; 63 V , 16 x 41; Manufacturer: Wurth Elektronik; partNo: 860040780019; E-mail: libraries@we-online.com; Characteristics: Aluminum Electrolytic Capacitor;Recommended soldering: Wave;Operating temperature: –40 °C to +105 °C;Minimized ESR and long life product series;Load life: 4000–10000 h @ +105 °C; ComponentLink1Description: Manufacturer; ComponentLink1URL: http://www.we-online.com; ComponentLink2Description: Datasheet; ComponentLink2URL: http://katalog.we-online.de/pbs/datasheet/860040780019.pdf; Created by: Karrer Zheng; Created Date: 5/13/2015; Capacitance: 1200 μF; Application: Applied to high frequency secondary side output filter loop, general switching power supply, DC-DC converter, AC-DC converter, adapter, charger, TV, VCR, DC motor circuit filter, LCD TV digital audio, digital TV, digital camera, digital video camera, satellite receiver and etc.
footprint WCAP-ATUL 16x41x7.5x0.8
pins: 1, 2

## WCAP-ATUL 18x31.5x7.5x0.8 860040781018
designator C?, comment 1000 μF
WCAP-ATUL Aluminum Electrolytic Capacitors , 1000 μF; + / - 20%; 63 V , 18 x 31,5; Manufacturer: Wurth Elektronik; partNo: 860040781018; E-mail: libraries@we-online.com; Characteristics: Aluminum Electrolytic Capacitor;Recommended soldering: Wave;Operating temperature: –40 °C to +105 °C;Minimized ESR and long life product series;Load life: 4000–10000 h @ +105 °C; ComponentLink1Description: Manufacturer; ComponentLink1URL: http://www.we-online.com; ComponentLink2Description: Datasheet; ComponentLink2URL: http://katalog.we-online.de/pbs/datasheet/860040781018.pdf; Created by: Karrer Zheng; Created Date: 5/13/2015; Capacitance: 1000 μF; Application: Applied to high frequency secondary side output filter loop, general switching power supply, DC-DC converter, AC-DC converter, adapter, charger, TV, VCR, DC motor circuit filter, LCD TV digital audio, digital TV, digital camera, digital video camera, satellite receiver and etc.
footprint WCAP-ATUL 18x31.5x7.5x0.8
pins: 1, 2

## WCAP-ATUL 18x35.5x7.5x0.8 860040781020
designator C?, comment 1200 μF
WCAP-ATUL Aluminum Electrolytic Capacitors , 1200 μF; + / - 20%; 63 V , 18 x 35,5; Manufacturer: Wurth Elektronik; partNo: 860040781020; E-mail: libraries@we-online.com; Characteristics: Aluminum Electrolytic Capacitor;Recommended soldering: Wave;Operating temperature: –40 °C to +105 °C;Minimized ESR and long life product series;Load life: 4000–10000 h @ +105 °C; ComponentLink1Description: Manufacturer; ComponentLink1URL: http://www.we-online.com; ComponentLink2Description: Datasheet; ComponentLink2URL: http://katalog.we-online.de/pbs/datasheet/860040781020.pdf; Created by: Karrer Zheng; Created Date: 5/13/2015; Capacitance: 1200 μF; Application: Applied to high frequency secondary side output filter loop, general switching power supply, DC-DC converter, AC-DC converter, adapter, charger, TV, VCR, DC motor circuit filter, LCD TV digital audio, digital TV, digital camera, digital video camera, satellite receiver and etc.
footprint WCAP-ATUL 18x35.5x7.5x0.8
pins: 1, 2

## WCAP-ATUL 18x41x7.5x0.8 860040781021
designator C?, comment 1500 μF
WCAP-ATUL Aluminum Electrolytic Capacitors , 1500 μF; + / - 20%; 63 V , 18 x 41; Manufacturer: Wurth Elektronik; partNo: 860040781021; E-mail: libraries@we-online.com; Characteristics: Aluminum Electrolytic Capacitor;Recommended soldering: Wave;Operating temperature: –40 °C to +105 °C;Minimized ESR and long life product series;Load life: 4000–10000 h @ +105 °C; ComponentLink1Description: Manufacturer; ComponentLink1URL: http://www.we-online.com; ComponentLink2Description: Datasheet; ComponentLink2URL: http://katalog.we-online.de/pbs/datasheet/860040781021.pdf; Created by: Karrer Zheng; Created Date: 5/13/2015; Capacitance: 1500 μF; Application: Applied to high frequency secondary side output filter loop, general switching power supply, DC-DC converter, AC-DC converter, adapter, charger, TV, VCR, DC motor circuit filter, LCD TV digital audio, digital TV, digital camera, digital video camera, satellite receiver and etc.
footprint WCAP-ATUL 18x41x7.5x0.8
pins: 1, 2


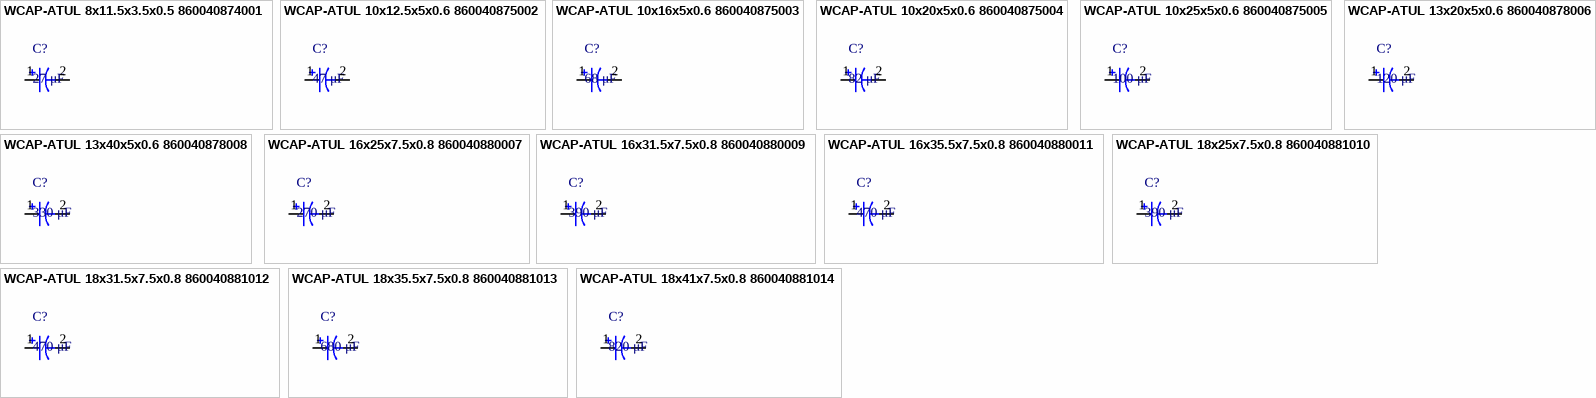
[diagram p6: symbols WCAP-ATUL 8x11.5x3.5x0.5 860040874001 to WCAP-ATUL 18x41x7.5x0.8 860040881014]